# Altium footprint library Common ICs PCB Lib.PcbLib: 13 footprints
Each footprint in its own frame and in the unit in brackets; x right, y up, seen from the top. Pads: shape width x height; smd on the part's side, far side on the other; paste and mask are expansions set on the pad; w line width, h text height; cw(c..) or ccw(c..) is an arc to the next point about the centre after c.
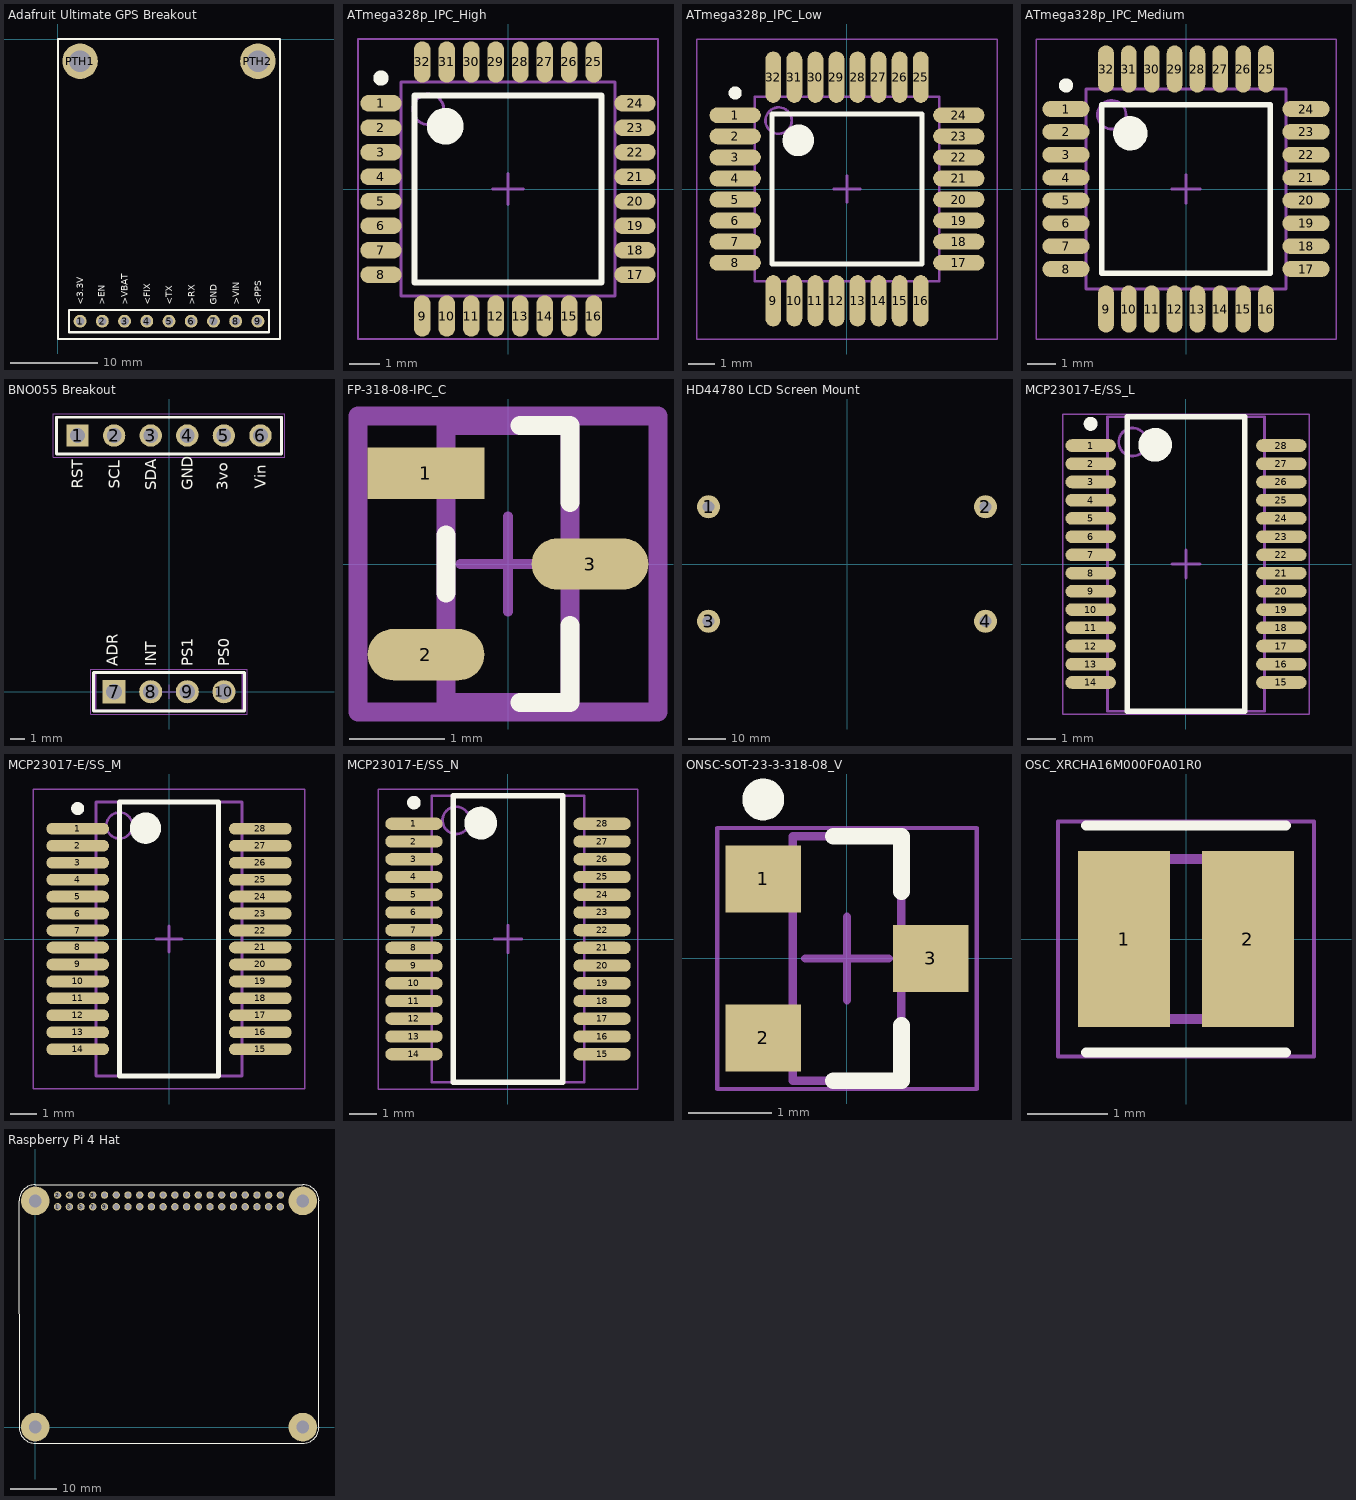
[diagram p0: the footprints below, top view; thin cyan lines are the x and y axes]

## Adafruit Ultimate GPS Breakout [mil]
pads (11):
  round 58 hole 38 mask+0: 1(100,-1270) 2(200,-1270) 3(300,-1270) 4(400,-1270) 5(500,-1270) 6(600,-1270) 7(700,-1270) 8(800,-1270) 9(900,-1270)
  round 160 hole 98.43: PTH1(100,-100) PTH2(900,-100)
Top Overlay:
  lines w10: 0,-1350 0,0 1000,0 1000,-1350 0,-1350 ; 50,-1320 950,-1320 950,-1220 50,-1220 50,-1320
  text "<3.3V" at 115,-1195 h30
  text ">EN" at 210,-1195 h30
  text ">VBAT" at 315,-1195 h30
  text "<FIX" at 415,-1195 h30
  text "<TX" at 515,-1195 h30
  text ">RX" at 615,-1195 h30
  text "GND" at 715,-1195 h30
  text ">VIN" at 815,-1195 h30
  text "<PPS" at 915,-1195 h30
3D body "Adafruit Ultimate GPS.step": height 500.39, standoff 430.71, extent 0,-1350 1000,0
3D body "m20-7820942_asm.stp": height 334.65, standoff -118.11, extent 42.13,-1319.21 957.87,-1220.79

## ATmega328p_IPC_High [mm] "Thin QFP, 32-Leads, Body 7x7mm, Pitch 0.8mm, IPC High Density"
height 1.2
pads (32):
  oval 1.35x0.55 smd: 1(-4.15,2.8) 2(-4.15,2) 3(-4.15,1.2) 4(-4.15,0.4) 5(-4.15,-0.4) 6(-4.15,-1.2) 7(-4.15,-2) 8(-4.15,-2.8) 17(4.15,-2.8) 18(4.15,-2) 19(4.15,-1.2) 20(4.15,-0.4) 21(4.15,0.4) 22(4.15,1.2) 23(4.15,2) 24(4.15,2.8)
  oval 0.55x1.35 smd: 9(-2.8,-4.15) 10(-2,-4.15) 11(-1.2,-4.15) 12(-0.4,-4.15) 13(0.4,-4.15) 14(1.2,-4.15) 15(2,-4.15) 16(2.8,-4.15) 25(2.8,4.15) 26(2,4.15) 27(1.2,4.15) 28(0.4,4.15) 29(-0.4,4.15) 30(-1.2,4.15) 31(-2,4.15) 32(-2.8,4.15)
Top Overlay:
  circle w0.25: c-4.15,3.625 r0.125
  circle w0.6: c-2.05,2.05 r0.3
  lines w0.2: -3.05,-3.05 -3.05,3.05 3.05,3.05 3.05,-3.05 -3.05,-3.05
Mechanical 13:
  circle w0.1: c-2.6,2.6 r0.5
  lines w0.1: -3.5,-3.5 -3.5,3.5 3.5,3.5 3.5,-3.5 -3.5,-3.5
Mechanical 15:
  lines w0.05: -4.9,-4.9 -4.9,4.9 4.9,4.9 4.9,-4.9 -4.9,-4.9
  lines w0.1: -0.5,0 0.5,0 ; 0,-0.5 0,0.5
3D body: height 1.2, standoff 0, extent -3.5,-3.5 3.5,3.5

## ATmega328p_IPC_Low [mm] "Thin QFP, 32-Leads, Body 7x7mm, Pitch 0.8mm, IPC Low Density"
height 1.2
pads (32):
  oval 1.95x0.6 smd: 1(-4.25,2.8) 2(-4.25,2) 3(-4.25,1.2) 4(-4.25,0.4) 5(-4.25,-0.4) 6(-4.25,-1.2) 7(-4.25,-2) 8(-4.25,-2.8) 17(4.25,-2.8) 18(4.25,-2) 19(4.25,-1.2) 20(4.25,-0.4) 21(4.25,0.4) 22(4.25,1.2) 23(4.25,2) 24(4.25,2.8)
  oval 0.6x1.95 smd: 9(-2.8,-4.25) 10(-2,-4.25) 11(-1.2,-4.25) 12(-0.4,-4.25) 13(0.4,-4.25) 14(1.2,-4.25) 15(2,-4.25) 16(2.8,-4.25) 25(2.8,4.25) 26(2,4.25) 27(1.2,4.25) 28(0.4,4.25) 29(-0.4,4.25) 30(-1.2,4.25) 31(-2,4.25) 32(-2.8,4.25)
Top Overlay:
  circle w0.25: c-4.25,3.65 r0.125
  circle w0.6: c-1.85,1.85 r0.3
  lines w0.2: -2.85,-2.85 -2.85,2.85 2.85,2.85 2.85,-2.85 -2.85,-2.85
Mechanical 13:
  circle w0.1: c-2.6,2.6 r0.5
  lines w0.1: -3.5,-3.5 -3.5,3.5 3.5,3.5 3.5,-3.5 -3.5,-3.5
Mechanical 15:
  lines w0.05: -5.7,-5.7 -5.7,5.7 5.7,5.7 5.7,-5.7 -5.7,-5.7
  lines w0.1: -0.5,0 0.5,0 ; 0,-0.5 0,0.5
3D body: height 1.2, standoff 0, extent -3.5,-3.5 3.5,3.5

## ATmega328p_IPC_Medium [mm] "Thin QFP, 32-Leads, Body 7x7mm, Pitch 0.8mm, IPC Medium Density"
height 1.2
pads (32):
  oval 1.65x0.55 smd: 1(-4.2,2.8) 2(-4.2,2) 3(-4.2,1.2) 4(-4.2,0.4) 5(-4.2,-0.4) 6(-4.2,-1.2) 7(-4.2,-2) 8(-4.2,-2.8) 17(4.2,-2.8) 18(4.2,-2) 19(4.2,-1.2) 20(4.2,-0.4) 21(4.2,0.4) 22(4.2,1.2) 23(4.2,2) 24(4.2,2.8)
  oval 0.55x1.65 smd: 9(-2.8,-4.2) 10(-2,-4.2) 11(-1.2,-4.2) 12(-0.4,-4.2) 13(0.4,-4.2) 14(1.2,-4.2) 15(2,-4.2) 16(2.8,-4.2) 25(2.8,4.2) 26(2,4.2) 27(1.2,4.2) 28(0.4,4.2) 29(-0.4,4.2) 30(-1.2,4.2) 31(-2,4.2) 32(-2.8,4.2)
Top Overlay:
  circle w0.6: c-1.95,1.95 r0.3
  circle w0.25: c-4.2,3.625 r0.125
  lines w0.2: -2.95,-2.95 2.95,-2.95 2.95,2.95 -2.95,2.95 -2.95,-2.95
Mechanical 13:
  circle w0.1: c-2.6,2.6 r0.5
  lines w0.1: -3.5,-3.5 3.5,-3.5 3.5,3.5 -3.5,3.5 -3.5,-3.5
Mechanical 15:
  lines w0.05: -5.25,-5.25 5.25,-5.25 5.25,5.25 -5.25,5.25 -5.25,-5.25
  lines w0.1: -0.5,0 0.5,0 ; 0,-0.5 0,0.5
3D body: height 1.2, standoff 0, extent -3.5,-3.5 3.5,3.5

## BNO055 Breakout [mm]
pads (10):
  rect 1.55x1.55 hole 1.02: 1(-6.35,17.78)
  round 1.55 hole 1.02: 2(-3.81,17.78) 3(-1.27,17.78) 4(1.27,17.78) 5(3.81,17.78) 6(6.35,17.78)
  rect 1.6x1.6 hole 1.1: 7(-3.81,0)
  round 1.6 hole 1.1: 8(-1.27,0) 9(1.27,0) 10(3.81,0)
Top Overlay:
  lines w0.2: -7.81,16.51 -7.81,19.05 7.81,19.05 7.81,16.51 -7.81,16.51 ; -5.23,-1.345 -5.23,1.345 5.23,1.345 5.23,-1.345 -5.23,-1.345
  text "Vin" at 6.731,14.097 h0.76
  text "3vo" at 4.064,13.97 h0.76
  text "GND" at 1.651,13.97 h0.76
  text "SDA" at -0.889,13.97 h0.76
  text "PS0" at 4.191,1.778 h0.76
  text "PS1" at 1.651,1.778 h0.76
  text "INT" at -0.889,1.778 h0.76
  text "ADR" at -3.556,1.778 h0.76
  text "RST" at -5.969,14.097 h0.76
  text "SCL" at -3.429,14.097 h0.76
Mechanical 13:
  lines w0.1: -7.81,16.51 -7.81,19.05 7.81,19.05 7.81,16.51 -7.81,16.51 ; -5.08,-1.27 5.08,-1.27 5.08,1.27 -5.08,1.27 -5.08,-1.27
Mechanical 15:
  lines w0.05: -0.5,0 0.5,0 ; 0,-0.5 0,0.5 ; -8.035,16.285 8.035,16.285 8.035,19.275 -8.035,19.275 -8.035,16.285 ; -5.43,-1.545 5.43,-1.545 5.43,1.545 -5.43,1.545 -5.43,-1.545
3D body "6-Pin Header - Female - 2.54mm.step": height 5, standoff -3, extent -7.87,16.53 7.87,19.03
3D body "4-Pin Header - Female - 2.54mm.step": height 5, standoff -3, extent -5.33,-1.25 5.33,1.25
3D body "Adafruit_BNO055_AP214.STEP": height 12.65, standoff 8.45, extent -13.335,-1.27 13.335,19.05

## FP-318-08-IPC_C [mm]
pads (3):
  rect 1.224x0.538 smd paste+0 mask+0: 1(-0.86,0.95)
  rrect100% 1.224x0.538 smd paste+0 mask+0: 2(-0.86,-0.95) 3(0.86,0)
Top Overlay:
  lines w0.2: -0.65,-0.306 -0.65,0.306 ; 0.127,-1.45 0.65,-1.45 0.65,-0.644 ; 0.127,1.45 0.65,1.45 0.65,0.644
Top 3D Body:
  lines w0.2: -0.65,-1.45 0.65,-1.45 0.65,1.45 -0.65,1.45 -0.65,-1.45
Top Courtyard:
  lines w0.2: -1.572,-1.55 1.572,-1.55 1.572,1.55 -1.572,1.55 -1.572,-1.55
Top Assembly:
  lines w0.2: -1.572,-1.55 1.572,-1.55 1.572,1.55 -1.572,1.55 -1.572,-1.55
Top Component Center:
  lines w0.1: -0.5,0 0.5,0 ; 0,-0.5 0,0.5
3D body "IC_ON_Semiconductor_NUD3112LT1G_eec.STEP": height 0.25, standoff 0, extent -1.572,-1.55 1.572,1.55

## HD44780 LCD Screen Mount [mm]
pads (4):
  round 6.25 hole 3.2 paste+0: 1(-37.5,15.5) 2(37.5,15.5) 3(-37.5,-15.5) 4(37.5,-15.5)
3D body "LCD AP214.STEP": height 27.8, standoff 5.17, extent -40,-18 40,18

## MCP23017-E/SS_L [mm] "SOP, 28-Leads, Body 10.2x5.2mm, Pitch 0.65mm, IPC High Density"
height 2
pads (28):
  oval 1.8x0.45 smd: 1(-3.4,4.225) 2(-3.4,3.575) 3(-3.4,2.925) 4(-3.4,2.275) 5(-3.4,1.625) 6(-3.4,0.975) 7(-3.4,0.325) 8(-3.4,-0.325) 9(-3.4,-0.975) 10(-3.4,-1.625) 11(-3.4,-2.275) 12(-3.4,-2.925) 13(-3.4,-3.575) 14(-3.4,-4.225) 15(3.4,-4.225) 16(3.4,-3.575) 17(3.4,-2.925) 18(3.4,-2.275) 19(3.4,-1.625) 20(3.4,-0.975) 21(3.4,-0.325) 22(3.4,0.325) 23(3.4,0.975) 24(3.4,1.625) 25(3.4,2.275) 26(3.4,2.925) 27(3.4,3.575) 28(3.4,4.225)
Top Overlay:
  circle w0.25: c-3.4,5 r0.125
  circle w0.6: c-1.1,4.25 r0.3
  lines w0.2: -2.1,-5.25 -2.1,5.25 2.1,5.25 2.1,-5.25 -2.1,-5.25
Mechanical 13:
  circle w0.1: c-1.9,4.35 r0.5
  lines w0.1: -2.8,-5.25 -2.8,5.25 2.8,5.25 2.8,-5.25 -2.8,-5.25
Mechanical 15:
  lines w0.05: -4.4,-5.35 -4.4,5.35 4.4,5.35 4.4,-5.35 -4.4,-5.35
  lines w0.1: -0.5,0 0.5,0 ; 0,-0.5 0,0.5
3D body: height 2, standoff 0.05, extent -2.8,-5.25 2.8,5.25

## MCP23017-E/SS_M [mm] "SOP, 28-Leads, Body 10.2x5.2mm, Pitch 0.65mm, IPC Low Density"
height 2
pads (28):
  oval 2.4x0.45 smd: 1(-3.5,4.225) 2(-3.5,3.575) 3(-3.5,2.925) 4(-3.5,2.275) 5(-3.5,1.625) 6(-3.5,0.975) 7(-3.5,0.325) 8(-3.5,-0.325) 9(-3.5,-0.975) 10(-3.5,-1.625) 11(-3.5,-2.275) 12(-3.5,-2.925) 13(-3.5,-3.575) 14(-3.5,-4.225) 15(3.5,-4.225) 16(3.5,-3.575) 17(3.5,-2.925) 18(3.5,-2.275) 19(3.5,-1.625) 20(3.5,-0.975) 21(3.5,-0.325) 22(3.5,0.325) 23(3.5,0.975) 24(3.5,1.625) 25(3.5,2.275) 26(3.5,2.925) 27(3.5,3.575) 28(3.5,4.225)
Top Overlay:
  circle w0.25: c-3.5,5 r0.125
  circle w0.6: c-0.9,4.25 r0.3
  lines w0.2: -1.9,-5.25 -1.9,5.25 1.9,5.25 1.9,-5.25 -1.9,-5.25
Mechanical 13:
  circle w0.1: c-1.9,4.35 r0.5
  lines w0.1: -2.8,-5.25 -2.8,5.25 2.8,5.25 2.8,-5.25 -2.8,-5.25
Mechanical 15:
  lines w0.05: -5.2,-5.75 -5.2,5.75 5.2,5.75 5.2,-5.75 -5.2,-5.75
  lines w0.1: -0.5,0 0.5,0 ; 0,-0.5 0,0.5
3D body: height 2, standoff 0.05, extent -2.8,-5.25 2.8,5.25

## MCP23017-E/SS_N [mm] "SOP, 28-Leads, Body 10.2x5.2mm, Pitch 0.65mm, IPC Medium Density"
height 2
pads (28):
  oval 2.1x0.45 smd: 1(-3.45,4.225) 2(-3.45,3.575) 3(-3.45,2.925) 4(-3.45,2.275) 5(-3.45,1.625) 6(-3.45,0.975) 7(-3.45,0.325) 8(-3.45,-0.325) 9(-3.45,-0.975) 10(-3.45,-1.625) 11(-3.45,-2.275) 12(-3.45,-2.925) 13(-3.45,-3.575) 14(-3.45,-4.225) 15(3.45,-4.225) 16(3.45,-3.575) 17(3.45,-2.925) 18(3.45,-2.275) 19(3.45,-1.625) 20(3.45,-0.975) 21(3.45,-0.325) 22(3.45,0.325) 23(3.45,0.975) 24(3.45,1.625) 25(3.45,2.275) 26(3.45,2.925) 27(3.45,3.575) 28(3.45,4.225)
Top Overlay:
  circle w0.25: c-3.45,5 r0.125
  circle w0.6: c-1,4.25 r0.3
  lines w0.2: -2,-5.25 -2,5.25 2,5.25 2,-5.25 -2,-5.25
Mechanical 13:
  circle w0.1: c-1.9,4.35 r0.5
  lines w0.1: -2.8,-5.25 -2.8,5.25 2.8,5.25 2.8,-5.25 -2.8,-5.25
Mechanical 15:
  lines w0.05: -4.75,-5.5 -4.75,5.5 4.75,5.5 4.75,-5.5 -4.75,-5.5
  lines w0.1: -0.5,0 0.5,0 ; 0,-0.5 0,0.5
3D body: height 2, standoff 0.05, extent -2.8,-5.25 2.8,5.25

## ONSC-SOT-23-3-318-08_V [mm] "SOT23, 3-Leads, Body 2.92x1.3mm, Pitch 0.95mm"
height 1.11
pads (3):
  rect 0.9x0.8 smd: 1(-1,0.95) 2(-1,-0.95) 3(1,0)
Top Overlay:
  circle w0.25: c-1,1.9 r0.125
  lines w0.2: -0.165,-1.46 0.65,-1.46 0.65,-0.8 ; -0.165,1.46 0.65,1.46 0.65,0.8
Mechanical 13:
  lines w0.1: -0.65,-1.46 0.65,-1.46 0.65,1.46 -0.65,1.46 -0.65,-1.46
Mechanical 15:
  lines w0.05: -1.55,-1.56 1.55,-1.56 1.55,1.56 -1.55,1.56 -1.55,-1.56
  lines w0.1: -0.5,0 0.5,0 ; 0,-0.5 0,0.5
3D body: height 1.11, standoff 0.01, extent -0.65,-1.46 0.65,1.46

## OSC_XRCHA16M000F0A01R0 [mm]
pads (2):
  rect 1.15x2.2 smd: 1(-0.775,0) 2(0.775,0)
Top Overlay:
  lines w0.127: -1.25,-1.42 1.25,-1.42 ; -1.25,1.42 1.25,1.42
Mechanical 13:
  lines w0.127: -1.25,-1 1.25,-1 1.25,1 -1.25,1 -1.25,-1
Mechanical 15:
  lines w0.05: -1.6,-1.47 -1.6,1.47 1.6,1.47 1.6,-1.47 -1.6,-1.47
3D body "XRCHA16M000F0A01R0--3DModel-STEP-56544.STEP": height 0.8, standoff 0, extent -1.25,-1 1.25,1

## Raspberry Pi 4 Hat [mm]
pads (44):
  round 1.6 hole 1.1: 1(4.87,47.73) 2(4.87,50.27) 3(7.41,47.73) 4(7.41,50.27) 5(9.95,47.73) 6(9.95,50.27) 7(12.49,47.73) 8(12.49,50.27) 9(15.03,47.73) 10(15.03,50.27) 11(17.57,47.73) 12(17.57,50.27) 13(20.11,47.73) 14(20.11,50.27) 15(22.65,47.73) 16(22.65,50.27) 17(25.19,47.73) 18(25.19,50.27) 19(27.73,47.73) 20(27.73,50.27) 21(30.27,47.73) 22(30.27,50.27) 23(32.81,47.73) 24(32.81,50.27) 25(35.35,47.73) 26(35.35,50.27) 27(37.89,47.73) 28(37.89,50.27) 29(40.43,47.73) 30(40.43,50.27) 31(42.97,47.73) 32(42.97,50.27) 33(45.51,47.73) 34(45.51,50.27) 35(48.05,47.73) 36(48.05,50.27) 37(50.59,47.73) 38(50.59,50.27) 39(53.13,47.73) 40(53.13,50.27)
  round 6.2 hole 2.75 paste+0: ""(0,0) ""(0,49) ""(58,0) ""(58,49)
Top Overlay:
  lines w0.254: -3.5,0 ccw(c0,0) 0,-3.5 58,-3.5 ccw(c58,0) 61.5,0 61.5,49 ccw(c58,49) 58,52.5 0,52.5 ccw(c0,49) -3.5,49 -3.5,0
Top Courtyard:
  circle w0.254: c0,0 r2.843
  circle w0.254: c58,0 r2.843
  circle w0.254: c0,49 r2.843
  circle w0.254: c58,49 r2.843
  lines w0.254: -0.3,0 0.3,0 ; 0,-0.3 0,0.3 ; 0,49 0.6,49 ; 0.3,48.7 0.3,49.3 ; 57.7,0.3 58.3,0.3 ; 57.7,49.3 58.3,49.3 ; 58,0 58,0.6 ; 58,49 58,49.6
3D body "Pin Header - RaspberryPi - Stacking - 2.54mm_V2.step": height 11.04, standoff -6.35, extent 3.35,46.214 54.65,51.54